# Altium footprint library IDETEC.PcbLib: 275 footprints (part 9 of 18)
Each footprint in its own frame and in the unit in brackets; x right, y up, seen from the top. Pads: shape width x height; smd on the part's side, far side on the other; paste and mask are expansions set on the pad; w line width, h text height; cw(c..) or ccw(c..) is an arc to the next point about the centre after c.
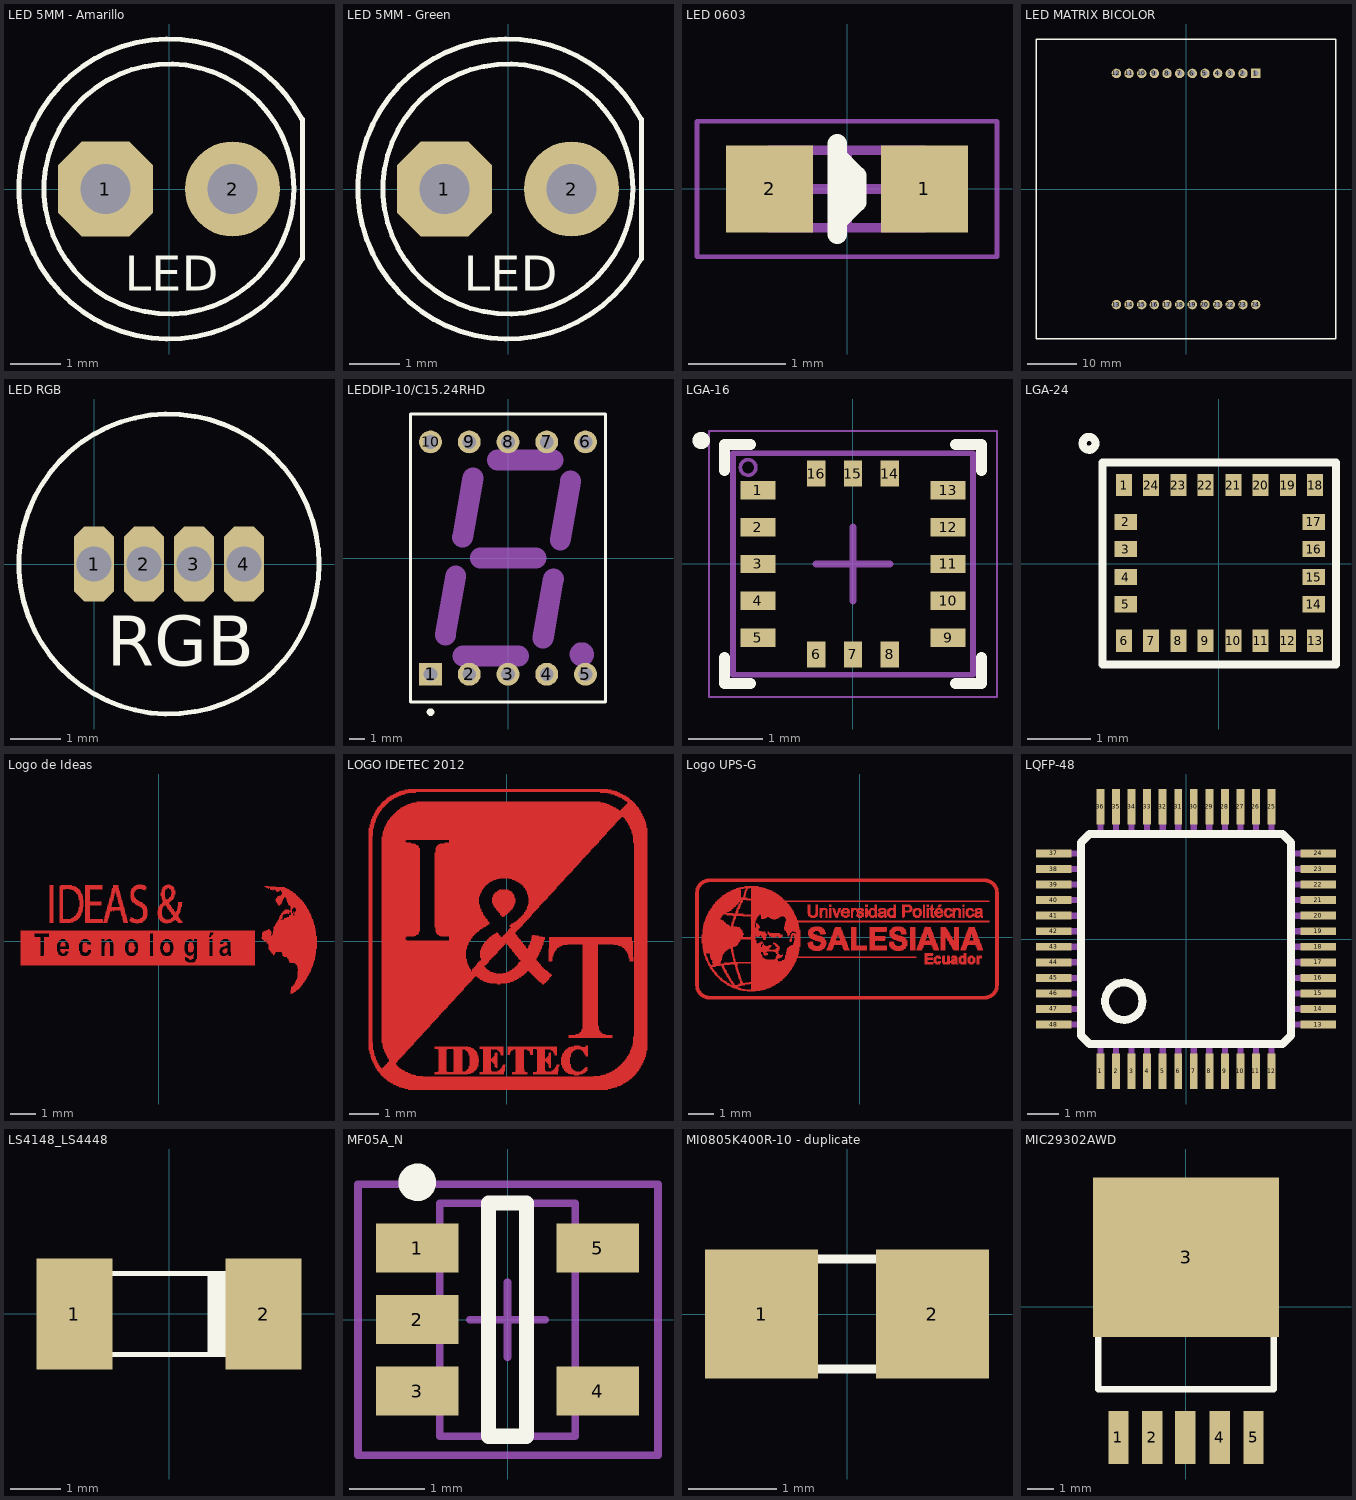
[diagram p8: the footprints below, top view; thin cyan lines are the x and y axes]

## LED 5MM - Amarillo [mm] "LED 5mm"
pads (2):
  oct 1.9x1.9 hole 1: 1(-1.27,0)
  round 1.9 hole 1: 2(1.27,0)
Top Overlay:
  circle w0.1: c0,0 r2.5
  lines w0.1: 2.651,-1.404 cw(c0,0) 2.651,1.404 ; 2.667,-1.397 2.667,1.397
  text "LED" at -0.889,-2.032 h0.7
3D body "User Library-LED-D5Y.STEP": height 9.74, standoff -5.7, extent -3,-3 2.5,3

## LED 5MM - Green [mm] "LED 5mm"
pads (2):
  oct 1.9x1.9 hole 1: 1(-1.27,0)
  round 1.9 hole 1: 2(1.27,0)
Top Overlay:
  circle w0.1: c0,0 r2.5
  lines w0.1: 2.651,-1.404 cw(c0,0) 2.651,1.404 ; 2.667,-1.397 2.667,1.397
  text "LED" at -0.889,-2.032 h0.7
3D body "User Library-LED-D5G.STEP": height 9.74, standoff -5.7, extent -3,-3 2.5,3

## LED 0603 [mm] "Chip Resistor, 2-Leads, Body 1,60x0,80mm, IPC Medium Density"
height 0.7
pads (2):
  rect 0.9x0.9 smd: 1(0.8,0) 2(-0.8,0)
Top Overlay:
  lines w0.15: -0.1,0 0.1,0
  lines w0.2: -0.1,-0.468 -0.1,0.468 ; -0.1,-0.336 0.1,-0.136 0.1,0.135 -0.1,0.335
Mechanical 13:
  lines w0.1: -0.8,-0.4 0.8,-0.4 0.8,0.4 -0.8,0.4 -0.8,-0.4
Mechanical 15:
  lines w0.05: -1.55,-0.7 1.55,-0.7 1.55,0.7 -1.55,0.7 -1.55,-0.7
  lines w0.1: -0.4,0 0.4,0 ; 0,-0.4 0,0.4
3D body "WL-SMCW_0603_LED.stp": height 0.7, standoff 0, extent -0.8,-0.4 0.8,0.4

## LED MATRIX BICOLOR [mm] "LED MATRIX BICOLOR"
pads (24):
  rect 1.9x1.9 hole 1.1: 1(13.97,23.2)
  round 1.9 hole 1.1: 2(11.43,23.2) 3(8.89,23.2) 4(6.35,23.2) 5(3.81,23.2) 6(1.27,23.2) 7(-1.27,23.2) 8(-3.81,23.2) 9(-6.35,23.2) 10(-8.89,23.2) 11(-11.43,23.2) 12(-13.97,23.2) 13(-13.97,-23.2) 14(-11.43,-23.2) 15(-8.89,-23.2) 16(-6.35,-23.2) 17(-3.81,-23.2) 18(-1.27,-23.2) 19(1.27,-23.2) 20(3.81,-23.2) 21(6.35,-23.2) 22(8.89,-23.2) 23(11.43,-23.2) 24(13.97,-23.2)
Top Overlay:
  lines w0.254: -30.1,-30.1 -30.1,30.1 30.1,30.1 30.1,-30.1 -30.1,-30.1

## LED RGB [mm] "Led RGB"
height 2
pads (4):
  oct 0.8x1.5 hole 0.7: 1(0,0) 2(1,0) 3(2,0) 4(3,0)
Top Overlay:
  circle w0.1: c1.5,0 r3
  text "RGB" at 0.254,-2.032 h1

## LEDDIP-10/C15.24RHD [mm] "LED, 7-Segment Display, 14.2 mm, RHD; 10 Leads; Row Space 15.24 mm; Pitch 2.54 mm"
height 8.25
pads (10):
  rect 1.5x1.5 hole 0.9: 1(-5.08,-7.62)
  round 1.5 hole 0.9: 2(-2.54,-7.62) 3(0,-7.62) 4(2.54,-7.62) 5(5.08,-7.62) 6(5.08,7.62) 7(2.54,7.62) 8(0,7.62) 9(-2.54,7.62) 10(-5.08,7.62)
Top Overlay:
  circle w0.25: c-5.08,-10.1 r0.125
  lines w0.2: -6.4,-9.45 -6.4,9.45 6.4,9.45 6.4,-9.45 -6.4,-9.45
Mechanical 1:
  circle w1: c4.842,-6.316 r0.296
  lines w1.37: -4.108,-5.054 -3.425,-1.17 ; -2.974,1.368 -2.293,5.255 ; -2.958,-6.429 0.692,-6.426 ; -1.821,0 1.828,0 ; -0.689,6.425 2.96,6.425 ; 2.295,-5.256 2.98,-1.371 ; 3.427,1.169 4.11,5.058
Mechanical 13:
  lines w0.1: -6.4,-9.45 6.4,-9.45 6.4,9.45 -6.4,9.45 -6.4,-9.45
3D body "SW3dPS-Disp_SA56-11.STEP": height 8.03, standoff -3.97, extent -6.3,-9.6 6.4,9.45

## LGA-16 [mm]
height 1
pads (16):
  rect 0.476x0.25 smd: 1(-1.287,1) 2(-1.287,0.5) 3(-1.287,0) 4(-1.287,-0.5) 5(-1.287,-1) 9(1.287,-1) 10(1.287,-0.5) 11(1.287,0) 12(1.287,0.5) 13(1.287,1)
  rect 0.25x0.35 smd: 6(-0.5,-1.225) 7(0,-1.225) 8(0.5,-1.225) 14(0.5,1.225) 15(0,1.225) 16(-0.5,1.225)
Top Overlay:
  circle w0.12: c-2.055,1.672 r0.057
  lines w0.15: -1.741,-1.264 -1.741,-1.616 -1.389,-1.616 ; -1.741,1.264 -1.741,1.616 -1.389,1.616 ; 1.389,-1.616 1.741,-1.616 1.741,-1.264 ; 1.389,1.616 1.741,1.616 1.741,1.264
Mechanical 13:
  circle w0.05: c-1.42,1.307 r0.105
  lines w0.08: -1.625,-1.5 -1.625,1.5 1.625,1.5 1.625,-1.5 -1.625,-1.5
Mechanical 15:
  lines w0.03: -1.95,-1.8 1.95,-1.8 1.95,1.8 -1.95,1.8 -1.95,-1.8
  lines w0.1: -0.5,0 0.5,0 ; 0,-0.5 0,0.5
3D body "User Library-LIS331AL.STEP": height 1.01, standoff -0.01, extent -1.5,-1.5 1.5,1.5

## LGA-24 [mil] "LGA24_3.5X3.1MM"
pads (24):
  rect 10x14 smd: 1(-59.25,49) 6(-59.25,-48.03) 7(-42.32,-48.03) 8(-25.39,-48.03) 9(-8.46,-48.03) 10(9,-48.03) 11(26,-48.03) 12(43,-48.03) 13(60,-48.03) 18(60,49) 19(43,49) 20(26,49) 21(9,49) 22(-8.46,49) 23(-25.39,49) 24(-42.32,49)
  rect 14x10 smd: 2(-58.07,26) 3(-58.07,9) 4(-58.07,-8.46) 5(-58.07,-25.39) 14(59,-25.39) 15(59,-8.46) 16(59,9) 17(59,26)
Top Overlay:
  circle w5: c-81.1,75 r4
  lines w5: -72.83,-62.99 73,-62.99 73,63 -72.83,63 -72.83,-62.99
3D body "User Library-LGA-24L.STEP": height 38.19, standoff -1.18, extent -68.66,-58.74 69.13,59.37

## Logo de Ideas [mm] "logo de Idetec"
Top Layer:
  lines w0.02: -2.249,2.061 -2.249,2.188 ; -2.238,2.061 -2.238,2.188 ; -2.229,2.061 -2.229,2.188 ; -2.218,2.061 -2.218,2.188
  lines w0.025: -5.419,-0.936 3.776,-0.936 ; -5.419,-0.911 3.776,-0.911 ; -5.419,-0.885 3.776,-0.885 ; -5.419,-0.86 3.776,-0.86 ; -5.419,-0.835 1.16,-0.835 ; -5.419,-0.809 1.109,-0.809 ; -5.419,-0.784 1.084,-0.784 ; -5.419,-0.758 1.058,-0.758 ; -5.419,-0.733 1.033,-0.733 ; -5.419,-0.708 1.033,-0.708 ; -5.419,-0.682 1.033,-0.682 ; -5.419,-0.657 1.033,-0.657 ; -5.419,-0.631 1.033,-0.631 ; -5.419,-0.606 1.363,-0.606 ; -5.419,-0.581 -4.657,-0.581 ; -5.419,-0.555 -4.657,-0.555 ; -5.419,-0.53 -4.657,-0.53 ; -5.419,-0.504 -4.657,-0.504 ; -5.419,-0.479 -4.657,-0.479 ; -5.419,-0.454 -4.657,-0.454 ; -5.419,-0.428 -4.657,-0.428 ; -5.419,-0.403 -4.657,-0.403 ; -5.419,-0.377 -4.657,-0.377 ; -5.419,-0.352 -4.657,-0.352 ; -5.419,-0.327 -4.657,-0.327 ; -5.419,-0.301 -4.657,-0.301 ; -5.419,-0.276 -4.657,-0.276 ; -5.419,-0.25 -4.657,-0.25 ; -5.419,-0.225 -4.657,-0.225 ; -5.419,-0.2 -4.657,-0.2 ; -5.419,-0.174 -4.657,-0.174 ; -5.419,-0.149 -4.657,-0.149 ; -5.419,-0.123 -4.657,-0.123 ; -5.419,-0.098 -4.657,-0.098 ; -5.419,-0.073 -4.657,-0.073 ; -5.419,-0.047 -4.657,-0.047 ; -5.419,-0.022 -4.657,-0.022 ; -5.419,0.004 -4.657,0.004 ; -5.419,0.029 -4.657,0.029 ; -5.419,0.054 -4.657,0.054 ; -5.419,0.08 -4.657,0.08 ; -5.419,0.105 -4.657,0.105 ; -5.419,0.131 -4.657,0.131 ; -5.419,0.156 -4.657,0.156 ; -5.419,0.181 -4.885,0.181 ; -5.419,0.207 -4.885,0.207 ; -5.419,0.232 -4.885,0.232 ; -5.419,0.258 -4.885,0.258 ; -5.419,0.283 -4.885,0.283 ; -5.419,0.308 -4.885,0.308 ; -5.419,0.334 2.024,0.334 ; -5.419,0.359 3.776,0.359 ; -5.419,0.385 3.776,0.385 ; -5.419,0.41 3.776,0.41 ; -4.53,-0.581 -3.844,-0.581 ; -4.504,-0.555 -3.895,-0.555 ; -4.504,-0.53 -3.92,-0.53 ; -4.504,-0.504 -3.945,-0.504 ; -4.504,-0.479 -3.971,-0.479 ; -4.504,-0.454 -3.971,-0.454 ; -4.504,-0.428 -3.971,-0.428 ; -4.504,-0.403 -3.996,-0.403 ; -4.504,-0.377 -3.996,-0.377 ; -4.504,-0.352 -3.996,-0.352 ; -4.504,-0.327 -3.996,-0.327 ; -4.504,-0.301 -3.996,-0.301 ; -4.504,-0.276 -3.996,-0.276 ; -4.504,-0.25 -3.996,-0.25 ; -4.504,-0.225 -3.996,-0.225 ; -4.504,-0.2 -3.996,-0.2 ; -4.504,-0.174 -3.996,-0.174 ; -4.504,-0.149 -3.996,-0.149 ; -4.504,-0.123 -3.996,-0.123 ; -4.504,-0.098 -3.996,-0.098 ; -4.504,-0.073 -3.971,-0.073 ; -4.504,-0.047 -3.971,-0.047 ; -4.504,-0.022 -3.945,-0.022 ; -4.504,0.004 -3.945,0.004 ; -4.504,0.029 -3.92,0.029 ; -4.504,0.054 -3.895,0.054 ; -4.504,0.08 -3.844,0.08 ; -4.504,0.105 -0.339,0.105 ; -4.504,0.131 -0.339,0.131 ; -4.504,0.156 -0.339,0.156 ; -4.301,0.181 -0.339,0.181 ; -4.301,0.207 -0.339,0.207 ; -4.301,0.232 -0.339,0.232 ; -4.301,0.258 -0.339,0.258 ; -4.301,0.283 -0.339,0.283 ; -4.301,0.308 -0.339,0.308 ; -4.276,0.74 -4.149,0.74 ; -4.276,0.766 -4.149,0.766 ; -4.276,0.791 -4.149,0.791 ; -4.276,0.816 -4.149,0.816 ; -4.276,0.842 -4.149,0.842 ; -4.276,0.867 -4.149,0.867 ; -4.276,0.893 -4.149,0.893 ; -4.276,0.918 -4.149,0.918 ; -4.276,0.943 -4.149,0.943 ; -4.276,0.969 -4.149,0.969 ; -4.276,0.994 -4.149,0.994 ; -4.276,1.02 -4.149,1.02 ; -4.276,1.045 -4.149,1.045 ; -4.276,1.07 -4.149,1.07 ; -4.276,1.096 -4.149,1.096 ; -4.276,1.121 -4.149,1.121 ; -4.276,1.147 -4.149,1.147 ; -4.276,1.172 -4.149,1.172 ; -4.276,1.197 -4.149,1.197 ; -4.276,1.223 -4.149,1.223 ; -4.276,1.248 -4.149,1.248 ; -4.276,1.274 -4.149,1.274 ; -4.276,1.299 -4.149,1.299 ; -4.276,1.324 -4.149,1.324 ; -4.276,1.35 -4.149,1.35 ; -4.276,1.375 -4.149,1.375 ; -4.276,1.401 -4.149,1.401 ; -4.276,1.426 -4.149,1.426 ; -4.276,1.451 -4.149,1.451 ; -4.276,1.477 -4.149,1.477 ; -4.276,1.502 -4.149,1.502 ; -4.276,1.528 -4.149,1.528 ; -4.276,1.553 -4.149,1.553 ; -4.276,1.578 -4.149,1.578 ; -4.276,1.604 -4.149,1.604 ; -4.276,1.629 -4.149,1.629 ; -4.276,1.655 -4.149,1.655 ; -4.276,1.68 -4.149,1.68 ; -4.276,1.705 -4.149,1.705 ; -4.276,1.731 -4.149,1.731 ; -4.276,1.756 -4.149,1.756 ; -4.276,1.782 -4.149,1.782 ; -4.276,1.807 -4.149,1.807 ; -4.276,1.832 -4.149,1.832 ; -4.276,1.858 -4.149,1.858 ; -4.276,1.883 -4.149,1.883 ; -4.276,1.909 -4.149,1.909 ; -4.276,1.934 -4.149,1.934 ; -4.276,1.959 -4.149,1.959 ; -4.276,1.985 -4.149,1.985 ; -4.276,2.01 -4.149,2.01 ; -4.276,2.036 -4.149,2.036 ; -4.276,2.061 -4.149,2.061 ; -4.276,2.086 -4.149,2.086 ; -4.276,2.112 -4.149,2.112 ; -4.276,2.137 -4.149,2.137 ; -4.276,2.163 -4.149,2.163 ; -4.276,2.188 -4.149,2.188 ; -3.895,0.74 -3.463,0.74 ; -3.895,0.766 -3.361,0.766 ; -3.895,0.791 -3.31,0.791 ; -3.895,0.816 -3.26,0.816 ; -3.895,0.842 -3.209,0.842 ; -3.895,0.867 -3.183,0.867 ; -3.895,0.893 -3.768,0.893 ; -3.895,0.918 -3.768,0.918 ; -3.895,0.943 -3.768,0.943 ; -3.895,0.969 -3.768,0.969 ; -3.895,0.994 -3.768,0.994 ; -3.895,1.02 -3.768,1.02 ; -3.895,1.045 -3.768,1.045 ; -3.895,1.07 -3.768,1.07 ; -3.895,1.096 -3.768,1.096 ; -3.895,1.121 -3.768,1.121 ; -3.895,1.147 -3.768,1.147 ; -3.895,1.172 -3.768,1.172 ; -3.895,1.197 -3.768,1.197 ; -3.895,1.223 -3.768,1.223 ; -3.895,1.248 -3.768,1.248 ; -3.895,1.274 -3.768,1.274 ; -3.895,1.299 -3.768,1.299 ; -3.895,1.324 -3.768,1.324 ; -3.895,1.35 -3.768,1.35 ; -3.895,1.375 -3.768,1.375 ; -3.895,1.401 -3.768,1.401 ; -3.895,1.426 -3.768,1.426 ; -3.895,1.451 -3.768,1.451 ; -3.895,1.477 -3.768,1.477 ; -3.895,1.502 -3.768,1.502 ; -3.895,1.528 -3.768,1.528 ; -3.895,1.553 -3.768,1.553 ; -3.895,1.578 -3.768,1.578 ; -3.895,1.604 -3.768,1.604 ; -3.895,1.629 -3.768,1.629 ; -3.895,1.655 -3.768,1.655 ; -3.895,1.68 -3.768,1.68 ; -3.895,1.705 -3.768,1.705 ; -3.895,1.731 -3.768,1.731 ; -3.895,1.756 -3.768,1.756 ; -3.895,1.782 -3.768,1.782 ; -3.895,1.807 -3.768,1.807 ; -3.895,1.832 -3.768,1.832 ; -3.895,1.858 -3.768,1.858 ; -3.895,1.883 -3.768,1.883 ; -3.895,1.909 -3.768,1.909 ; -3.895,1.934 -3.768,1.934 ; -3.895,1.959 -3.768,1.959 ; -3.895,1.985 -3.768,1.985 ; -3.895,2.01 -3.768,2.01 ; -3.895,2.036 -3.768,2.036 ; -3.895,2.061 -3.666,2.061 ; -3.895,2.086 -3.183,2.086 ; -3.895,2.112 -3.209,2.112 ; -3.895,2.137 -3.26,2.137 ; -3.895,2.163 -3.31,2.163 ; -3.869,-0.327 -3.133,-0.327 ; -3.869,-0.174 -3.666,-0.174 ; -3.844,-0.403 -3.666,-0.403 ; -3.844,-0.377 -3.666,-0.377 ; -3.844,-0.352 -3.133,-0.352 ; -3.844,-0.149 -3.666,-0.149 ; -3.844,-0.123 -3.666,-0.123 ; -3.844,-0.098 -3.666,-0.098 ; -3.844,2.188 -3.412,2.188 ; -3.818,-0.428 -3.691,-0.428 ; -3.818,-0.073 -3.691,-0.073 ; -3.793,-0.454 -3.717,-0.454 ; -3.793,-0.047 -3.742,-0.047 ; -3.666,-0.581 -2.98,-0.581 ; -3.666,0.08 -2.98,0.08 ; -3.641,0.054 -3.031,0.054 ; -3.615,-0.555 -3.031,-0.555 ; -3.615,-0.377 -3.133,-0.377 ; -3.615,0.029 -3.056,0.029 ; -3.59,-0.53 -3.056,-0.53 ; -3.59,0.004 -3.056,0.004 ; -3.564,-0.504 -3.082,-0.504 ; -3.564,-0.479 -3.082,-0.479 ; -3.564,-0.047 -3.107,-0.047 ; -3.564,-0.022 -3.082,-0.022 ; -3.539,-0.454 -3.107,-0.454 ; -3.539,-0.428 -3.107,-0.428 ; -3.539,-0.123 -3.133,-0.123 ; -3.539,-0.098 -3.133,-0.098 ; -3.539,-0.073 -3.107,-0.073 ; -3.514,-0.403 -3.107,-0.403 ; -3.514,-0.301 -3.133,-0.301 ; -3.514,-0.276 -3.133,-0.276 ; -3.514,-0.25 -3.133,-0.25 ; -3.514,-0.225 -3.133,-0.225 ; -3.514,-0.2 -3.133,-0.2 ; -3.514,-0.174 -3.133,-0.174 ; -3.514,-0.149 -3.133,-0.149 ; -3.514,2.061 -3.158,2.061 ; -3.437,0.893 -3.158,0.893 ; -3.412,2.036 -3.133,2.036 ; -3.387,0.918 -3.133,0.918 ; -3.361,2.01 -3.107,2.01 ; -3.336,0.943 -3.107,0.943 ; -3.31,0.969 -3.107,0.969 ; -3.31,1.985 -3.082,1.985 ; -3.285,0.994 -3.082,0.994 ; -3.285,1.959 -3.082,1.959 ; -3.26,1.02 -3.056,1.02 ; -3.26,1.934 -3.056,1.934 ; -3.234,1.045 -3.056,1.045 ; -3.234,1.909 -3.056,1.909 ; -3.209,1.07 -3.031,1.07 ; -3.209,1.096 -3.031,1.096 ; -3.209,1.883 -3.031,1.883 ; -3.183,1.121 -3.031,1.121 ; -3.183,1.147 -3.006,1.147 ; -3.183,1.832 -3.006,1.832 ; -3.183,1.858 -3.031,1.858 ; -3.158,1.172 -3.006,1.172 ; -3.158,1.197 -3.006,1.197 ; -3.158,1.756 -2.98,1.756 ; -3.158,1.782 -3.006,1.782 ; -3.158,1.807 -3.006,1.807 ; -3.133,1.223 -2.98,1.223 ; -3.133,1.248 -2.98,1.248 ; -3.133,1.274 -2.98,1.274 ; -3.133,1.299 -2.98,1.299 ; -3.133,1.324 -2.98,1.324 ; -3.133,1.655 -2.98,1.655 ; -3.133,1.68 -2.98,1.68 ; -3.133,1.705 -2.98,1.705 ; -3.133,1.731 -2.98,1.731 ; -3.107,1.35 -2.98,1.35 ; -3.107,1.375 -2.955,1.375 ; -3.107,1.401 -2.955,1.401 ; -3.107,1.426 -2.955,1.426 ; -3.107,1.451 -2.955,1.451 ; -3.107,1.477 -2.955,1.477 ; -3.107,1.502 -2.955,1.502 ; -3.107,1.528 -2.955,1.528 ; -3.107,1.553 -2.955,1.553 ; -3.107,1.578 -2.955,1.578 ; -3.107,1.604 -2.955,1.604 ; -3.107,1.629 -2.955,1.629 ; -2.98,-0.377 -2.802,-0.377 ; -2.98,-0.352 -2.777,-0.352 ; -2.98,-0.327 -2.244,-0.327 ; -2.98,-0.301 -2.244,-0.301 ; -2.98,-0.276 -2.244,-0.276 ; -2.98,-0.25 -2.244,-0.25 ; -2.98,-0.225 -2.244,-0.225 ; -2.98,-0.2 -2.244,-0.2 ; -2.98,-0.174 -2.244,-0.174 ; -2.98,-0.149 -2.244,-0.149 ; -2.98,-0.123 -2.802,-0.123 ; -2.955,-0.403 -2.802,-0.403 ; -2.955,-0.098 -2.802,-0.098 ; -2.955,-0.073 -2.828,-0.073 ; -2.929,-0.428 -2.828,-0.428 ; -2.853,0.74 -2.218,0.74 ; -2.853,0.766 -2.193,0.766 ; -2.853,0.791 -2.193,0.791 ; -2.853,0.816 -2.193,0.816 ; -2.853,0.842 -2.193,0.842 ; -2.853,0.867 -2.193,0.867 ; -2.853,0.893 -2.701,0.893 ; -2.853,0.918 -2.701,0.918 ; -2.853,0.943 -2.701,0.943 ; -2.853,0.969 -2.701,0.969 ; -2.853,0.994 -2.701,0.994 ; -2.853,1.02 -2.701,1.02 ; -2.853,1.045 -2.701,1.045 ; -2.853,1.07 -2.701,1.07 ; -2.853,1.096 -2.701,1.096 ; -2.853,1.121 -2.701,1.121 ; -2.853,1.147 -2.701,1.147 ; -2.853,1.172 -2.701,1.172 ; -2.853,1.197 -2.701,1.197 ; -2.853,1.223 -2.701,1.223 ; -2.853,1.248 -2.701,1.248 ; -2.853,1.274 -2.701,1.274 ; -2.853,1.299 -2.701,1.299 ; -2.853,1.324 -2.701,1.324 ; -2.853,1.35 -2.701,1.35 ; -2.853,1.375 -2.701,1.375 ; -2.853,1.401 -2.701,1.401 ; -2.853,1.426 -2.259,1.428 ; -2.853,1.451 -2.244,1.451 ; -2.853,1.477 -2.269,1.477 ; -2.853,1.502 -2.244,1.502 ; -2.853,1.528 -2.244,1.528 ; -2.853,1.553 -2.244,1.553 ; -2.853,1.578 -2.701,1.578 ; -2.853,1.604 -2.701,1.604 ; -2.853,1.629 -2.701,1.629 ; -2.853,1.655 -2.701,1.655 ; -2.853,1.68 -2.701,1.68 ; -2.853,1.705 -2.701,1.705 ; -2.853,1.731 -2.701,1.731 ; -2.853,1.756 -2.701,1.756 ; -2.853,1.782 -2.701,1.782 ; -2.853,1.807 -2.701,1.807 ; -2.853,1.832 -2.701,1.832 ; -2.853,1.858 -2.701,1.858 ; -2.853,1.883 -2.701,1.883 ; -2.853,1.909 -2.701,1.909 ; -2.853,1.934 -2.701,1.934 ; -2.853,1.959 -2.701,1.959 ; -2.853,1.985 -2.701,1.985 ; -2.853,2.01 -2.701,2.01 ; -2.853,2.036 -2.701,2.036 ; -2.853,2.061 -2.218,2.061 ; -2.853,2.086 -2.244,2.086 ; -2.853,2.112 -2.244,2.112 ; -2.853,2.137 -2.244,2.137 ; -2.853,2.163 -2.244,2.163 ; -2.853,2.188 -2.218,2.188 ; -2.777,-0.581 -2.244,-0.581 ; -2.777,0.08 -2.244,0.08 ; -2.752,-0.555 -2.244,-0.555 ; -2.752,0.054 -2.244,0.054 ; -2.726,-0.53 -2.244,-0.53 ; -2.726,0.029 -2.244,0.029 ; -2.701,-0.504 -2.244,-0.504 ; -2.701,0.004 -2.244,0.004 ; -2.675,-0.479 -2.244,-0.479 ; -2.675,-0.454 -2.244,-0.454 ; -2.675,-0.047 -2.244,-0.047 ; -2.675,-0.022 -2.244,-0.022 ; -2.65,-0.428 -2.244,-0.428 ; -2.65,-0.403 -2.244,-0.403 ; -2.65,-0.377 -2.244,-0.377 ; -2.65,-0.352 -2.244,-0.352 ; -2.65,-0.123 -2.244,-0.123 ; -2.65,-0.098 -2.244,-0.098 ; -2.65,-0.073 -2.244,-0.073 ; -2.167,0.74 -2.015,0.74 ; -2.167,0.766 -2.015,0.766 ; -2.142,0.791 -2.015,0.791 ; -2.142,0.816 -1.99,0.816 ; -2.142,0.842 -1.99,0.842 ; -2.142,0.867 -1.99,0.867 ; -2.117,-0.581 -1.913,-0.581 ; -2.117,-0.555 -1.913,-0.555 ; -2.117,-0.53 -1.913,-0.53 ; -2.117,-0.504 -1.913,-0.504 ; -2.117,-0.479 -1.913,-0.479 ; -2.117,-0.454 -1.913,-0.454 ; -2.117,-0.428 -1.913,-0.428 ; -2.117,-0.403 -1.913,-0.403 ; -2.117,-0.377 -1.913,-0.377 ; -2.117,-0.352 -1.913,-0.352 ; -2.117,-0.327 -1.913,-0.327 ; -2.117,-0.301 -1.913,-0.301 ; -2.117,-0.276 -1.913,-0.276 ; -2.117,-0.25 -1.913,-0.25 ; -2.117,-0.225 -1.913,-0.225 ; -2.117,-0.2 -1.913,-0.2 ; -2.117,0.029 -2.091,0.029 ; -2.117,0.054 -2.066,0.054 ; -2.117,0.08 -2.015,0.08 ; -2.117,0.893 -1.99,0.893 ; -2.117,0.918 -1.964,0.918 ; -2.117,0.943 -1.964,0.943 ; -2.117,0.969 -1.964,0.969 ; -2.091,-0.174 -1.913,-0.174 ; -2.091,-0.149 -1.913,-0.149 ; -2.091,-0.123 -1.913,-0.123 ; -2.091,-0.098 -1.913,-0.098 ; -2.091,0.994 -1.939,0.994 ; -2.091,1.02 -1.939,1.02 ; -2.091,1.045 -1.939,1.045 ; -2.066,-0.073 -1.939,-0.073 ; -2.066,1.07 -1.939,1.07 ; -2.066,1.096 -1.913,1.096 ; -2.066,1.121 -1.913,1.121 ; -2.066,1.147 -1.913,1.147 ; -2.04,1.172 -1.913,1.172 ; -2.04,1.197 -1.888,1.197 ; -2.04,1.223 -1.329,1.223 ; -2.04,1.248 -1.355,1.248 ; -2.015,-0.047 -1.964,-0.047 ; -2.015,1.274 -1.355,1.274 ; -2.015,1.299 -1.355,1.299 ; -2.015,1.324 -1.355,1.324 ; -1.99,1.35 -1.863,1.35 ; -1.99,1.375 -1.863,1.375 ; -1.99,1.401 -1.863,1.401 ; -1.99,1.426 -1.837,1.426 ; -1.964,1.451 -1.837,1.451 ; -1.964,1.477 -1.837,1.477 ; -1.964,1.502 -1.837,1.502 ; -1.964,1.528 -1.812,1.528 ; -1.939,1.553 -1.812,1.553 ; -1.939,1.578 -1.812,1.578 ; -1.939,1.604 -1.786,1.604 ; -1.939,1.629 -1.786,1.629 ; -1.913,1.655 -1.786,1.655 ; -1.913,1.68 -1.786,1.68 ; -1.913,1.705 -1.761,1.705 ; -1.888,1.731 -1.761,1.731 ; -1.888,1.756 -1.761,1.756 ; -1.888,1.782 -1.761,1.782 ; -1.888,1.807 -1.736,1.807 ; -1.863,0.08 -1.151,0.08 ; -1.863,1.197 -1.837,1.197 ; -1.863,1.832 -1.736,1.832 ; -1.863,1.858 -1.736,1.858 ; -1.863,1.883 -1.736,1.883 ; -1.863,1.909 -1.71,1.909 ; -1.837,0.054 -1.202,0.054 ; -1.837,1.934 -1.71,1.934 ; -1.837,1.959 -1.71,1.959 ; -1.837,1.985 -1.71,1.985 ; -1.837,2.01 -1.71,2.01 ; -1.812,0.029 -1.228,0.029 ; -1.812,2.036 -1.558,2.036 ; -1.812,2.061 -1.558,2.061 ; -1.812,2.086 -1.558,2.086 ; -1.786,-0.581 -1.151,-0.581 ; -1.786,-0.073 -1.304,-0.073 ; -1.786,-0.047 -1.278,-0.047 ; -1.786,-0.022 -1.278,-0.022 ; -1.786,0.004 -1.253,0.004 ; -1.786,1.197 -1.761,1.197 ; -1.786,2.112 -1.583,2.112 ; -1.786,2.137 -1.583,2.137 ; -1.786,2.163 -1.583,2.163 ; -1.786,2.188 -1.583,2.188 ; -1.761,-0.555 -1.202,-0.555 ; -1.761,-0.53 -1.228,-0.53 ; -1.761,-0.504 -1.253,-0.504 ; -1.761,-0.479 -1.278,-0.479 ; -1.761,-0.454 -1.278,-0.454 ; -1.761,-0.428 -1.304,-0.428 ; -1.761,-0.403 -1.304,-0.403 ; -1.761,-0.377 -1.304,-0.377 ; -1.761,-0.352 -1.329,-0.352 ; -1.761,-0.327 -1.329,-0.327 ; -1.761,-0.301 -1.329,-0.301 ; -1.761,-0.276 -1.329,-0.276 ; -1.761,-0.25 -1.329,-0.25 ; -1.761,-0.225 -1.329,-0.225 ; -1.761,-0.2 -1.329,-0.2 ; -1.761,-0.174 -1.329,-0.174 ; -1.761,-0.149 -1.329,-0.149 ; -1.761,-0.123 -1.304,-0.123 ; -1.761,-0.098 -1.304,-0.098 ; -1.685,1.985 -1.532,1.985 ; -1.685,2.01 -1.558,2.01 ; -1.659,1.858 -1.507,1.858 ; -1.659,1.883 -1.507,1.883 ; -1.659,1.909 -1.532,1.909 ; -1.659,1.934 -1.532,1.934 ; -1.659,1.959 -1.532,1.959 ; -1.634,1.756 -1.482,1.756 ; -1.634,1.782 -1.482,1.782 ; -1.634,1.807 -1.507,1.807 ; -1.634,1.832 -1.507,1.832 ; -1.609,1.655 -1.456,1.655 ; -1.609,1.68 -1.456,1.68 ; -1.609,1.705 -1.456,1.705 ; -1.609,1.731 -1.482,1.731 ; -1.583,1.553 -1.431,1.553 ; -1.583,1.578 -1.431,1.578 ; -1.583,1.604 -1.431,1.604 ; -1.583,1.629 -1.456,1.629 ; -1.558,1.477 -1.405,1.477 ; -1.558,1.502 -1.405,1.502 ; -1.558,1.528 -1.431,1.528 ; -1.532,1.375 -1.38,1.375 ; -1.532,1.401 -1.38,1.401 ; -1.532,1.426 -1.38,1.426 ; -1.532,1.451 -1.405,1.451 ; -1.507,1.35 -1.38,1.35 ; -1.482,1.147 -1.329,1.147 ; -1.482,1.172 -1.329,1.172 ; -1.482,1.197 -1.329,1.197 ; -1.456,1.045 -1.278,1.045 ; -1.456,1.07 -1.304,1.07 ; -1.456,1.096 -1.304,1.096 ; -1.456,1.121 -1.304,1.121 ; -1.431,0.969 -1.278,0.969 ; -1.431,0.994 -1.278,0.994 ; -1.431,1.02 -1.278,1.02 ; -1.405,0.867 -1.253,0.867 ; -1.405,0.893 -1.253,0.893 ; -1.405,0.918 -1.253,0.918 ; -1.405,0.943 -1.253,0.943 ; -1.38,0.766 -1.202,0.766 ; -1.38,0.791 -1.228,0.791 ; -1.38,0.816 -1.228,0.816 ; -1.38,0.842 -1.228,0.842 ; -1.355,0.74 -1.202,0.74 ; -1.177,-0.352 -0.948,-0.352 ; -1.177,-0.327 -0.948,-0.327 ; -1.177,-0.301 -0.948,-0.301 ; -1.177,-0.276 -0.923,-0.276 ; -1.177,-0.25 -0.923,-0.25 ; -1.177,-0.225 -0.923,-0.225 ; -1.177,-0.2 -0.948,-0.2 ; -1.177,-0.174 -0.948,-0.174 ; -1.177,-0.149 -0.948,-0.149 ; -1.151,-0.403 -0.974,-0.403 ; -1.151,-0.377 -0.948,-0.377 ; -1.151,-0.123 -0.948,-0.123 ; -1.151,-0.098 -0.974,-0.098 ; -1.126,-0.428 -0.999,-0.428 ; -1.126,-0.073 -0.999,-0.073 ; -1.126,0.791 -0.593,0.791 ; -1.126,0.816 -0.567,0.816 ; -1.126,0.842 -0.542,0.842 ; -1.126,0.867 -0.872,0.867 ; -1.101,0.893 -0.974,0.893 ; -1.101,0.918 -1.024,0.918 ; -1.101,0.943 -1.075,0.943 ; -1.101,1.705 -0.923,1.705 ; -1.101,1.731 -0.948,1.731 ; -1.101,1.756 -0.948,1.756 ; -1.101,1.782 -0.948,1.782 ; -1.101,1.807 -0.974,1.807 ; -1.101,1.832 -0.974,1.832 ; -1.101,1.858 -0.974,1.858 ; -1.101,1.883 -0.974,1.883 ; -1.101,1.909 -0.948,1.909 ; -1.101,1.934 -0.948,1.934 ; -1.101,1.959 -0.948,1.959 ; -1.075,0.766 -0.618,0.766 ; -1.075,1.629 -0.847,1.629 ; -1.075,1.655 -0.872,1.655 ; -1.075,1.68 -0.897,1.68 ; -1.075,1.985 -0.923,1.985 ; -1.075,2.01 -0.897,2.01 ; -1.05,1.604 -0.821,1.604 ; -1.05,2.036 -0.872,2.036 ; -1.05,2.061 -0.821,2.061 ; -1.024,1.553 -0.72,1.553 ; -1.024,1.578 -0.77,1.578 ; -1.024,2.086 -0.491,2.086 ; -0.999,0.74 -0.669,0.74 ; -0.999,2.112 -0.491,2.112 ; -0.974,-0.581 -0.339,-0.581 ; -0.974,0.08 -0.339,0.08 ; -0.974,1.528 -0.669,1.528 ; -0.974,2.137 -0.491,2.137 ; -0.948,1.502 -0.618,1.502 ; -0.948,2.163 -0.516,2.163 ; -0.923,-0.555 -0.339,-0.555 ; -0.923,0.054 -0.339,0.054 ; -0.923,1.477 -0.593,1.477 ; -0.897,-0.53 -0.339,-0.53 ; -0.897,0.029 -0.339,0.029 ; -0.897,0.715 -0.796,0.715 ; -0.897,2.188 -0.542,2.188 ; -0.872,-0.504 -0.339,-0.504 ; -0.872,0.004 -0.339,0.004 ; -0.872,1.451 -0.567,1.451 ; -0.847,-0.479 -0.339,-0.479 ; -0.847,-0.022 -0.339,-0.022 ; -0.847,1.426 -0.542,1.426 ; -0.821,-0.454 -0.339,-0.454 ; -0.821,-0.428 -0.339,-0.428 ; -0.821,-0.403 -0.339,-0.403 ; -0.821,-0.098 -0.339,-0.098 ; -0.821,-0.073 -0.339,-0.073 ; -0.821,-0.047 -0.339,-0.047 ; -0.821,2.213 -0.643,2.213 ; -0.796,-0.377 -0.339,-0.377 ; -0.796,-0.352 -0.339,-0.352 ; -0.796,-0.327 -0.339,-0.327 ; -0.796,-0.301 -0.339,-0.301 ; -0.796,-0.276 -0.339,-0.276 ; -0.796,-0.25 -0.339,-0.25 ; -0.796,-0.225 -0.339,-0.225 ; -0.796,-0.2 -0.339,-0.2 ; -0.796,-0.174 -0.339,-0.174 ; -0.796,-0.149 -0.339,-0.149 ; -0.796,-0.123 -0.339,-0.123 ; -0.796,0.867 -0.516,0.867 ; -0.796,1.401 -0.516,1.401 ; -0.745,1.375 -0.491,1.375 ; -0.72,0.893 -0.491,0.893 ; -0.694,1.35 -0.491,1.35 ; -0.669,0.918 -0.491,0.918 ; -0.669,1.324 -0.466,1.324 ; -0.669,2.061 -0.516,2.061 ; -0.643,0.943 -0.466,0.943 ; -0.643,1.299 -0.466,1.299 ; -0.618,0.969 -0.466,0.969 ; -0.618,0.994 -0.466,0.994 ; -0.618,1.248 -0.44,1.248 ; -0.618,1.274 -0.466,1.274 ; -0.593,1.02 -0.44,1.02 ; -0.593,1.045 -0.44,1.045 ; -0.593,1.07 -0.44,1.07 ; -0.593,1.096 -0.44,1.096 ; -0.593,1.121 -0.44,1.121 ; -0.593,1.147 -0.44,1.147 ; -0.593,1.172 -0.44,1.172 ; -0.593,1.197 -0.44,1.197 ; -0.593,1.223 -0.44,1.223 ; -0.593,2.036 -0.516,2.036 ; -0.542,2.01 -0.516,2.01 ; -0.212,-0.581 0.246,-0.581 ; -0.212,-0.53 0.144,-0.53 ; -0.212,-0.479 0.119,-0.479 ; -0.212,-0.454 0.093,-0.454 ; -0.212,-0.428 0.093,-0.428 ; -0.212,-0.403 0.068,-0.403 ; -0.212,-0.377 0.068,-0.377 ; -0.212,-0.352 0.068,-0.352 ; -0.212,-0.327 0.068,-0.327 ; -0.212,-0.301 0.042,-0.301 ; -0.212,-0.276 0.042,-0.276 ; -0.212,-0.25 0.042,-0.25 ; -0.212,-0.225 0.042,-0.225 ; -0.212,-0.2 0.042,-0.2 ; -0.212,-0.174 0.068,-0.174 ; -0.212,-0.149 0.068,-0.149 ; -0.212,-0.123 0.068,-0.123 ; -0.212,-0.098 0.068,-0.098 ; -0.212,-0.073 0.093,-0.073 ; -0.212,-0.047 0.093,-0.047 ; -0.212,-0.022 0.119,-0.022 ; -0.212,0.004 0.144,0.004 ; -0.212,0.029 0.144,0.029 ; -0.212,0.054 0.195,0.054 ; -0.212,0.08 0.246,0.08 ; -0.212,0.105 3.776,0.105 ; -0.212,0.131 3.776,0.131 ; -0.212,0.156 3.776,0.156 ; -0.212,0.181 1.973,0.181 ; -0.212,0.207 1.973,0.207 ; -0.212,0.232 1.998,0.232 ; -0.212,0.258 1.998,0.258 ; -0.212,0.283 1.998,0.283 ; -0.212,0.308 2.024,0.308 ; -0.186,-0.555 0.195,-0.555 ; -0.186,-0.504 0.119,-0.504 ; -0.034,1.045 0.119,1.045 ; -0.034,1.07 0.119,1.07 ; -0.034,1.096 0.119,1.096 ; -0.034,1.121 0.119,1.121 ; -0.034,1.147 0.119,1.147 ; -0.034,1.172 0.119,1.172 ; -0.034,1.197 0.119,1.197 ; -0.008,0.943 0.169,0.943 ; -0.008,0.969 0.144,0.969 ; -0.008,0.994 0.144,0.994 ; -0.008,1.02 0.144,1.02 ; -0.008,1.223 0.119,1.223 ; -0.008,1.248 0.119,1.248 ; -0.008,1.274 0.144,1.274 ; -0.008,1.299 0.144,1.299 ; 0.017,0.893 0.22,0.893 ; 0.017,0.918 0.195,0.918 ; 0.017,1.324 0.144,1.324 ; 0.017,1.35 0.169,1.35 ; 0.042,0.867 0.271,0.867 ; 0.042,1.375 0.195,1.375 ; 0.042,1.401 0.22,1.401 ; 0.068,0.816 0.601,0.816 ; 0.068,0.842 0.627,0.842 ; 0.068,1.426 0.246,1.426 ; 0.093,0.791 